# Altium footprint library DrPCB.PcbLib: 910 footprints (part 31 of 57)
Each footprint in its own frame and in the unit in brackets; x right, y up, seen from the top. Pads: shape width x height; smd on the part's side, far side on the other; paste and mask are expansions set on the pad; w line width, h text height; cw(c..) or ccw(c..) is an arc to the next point about the centre after c.
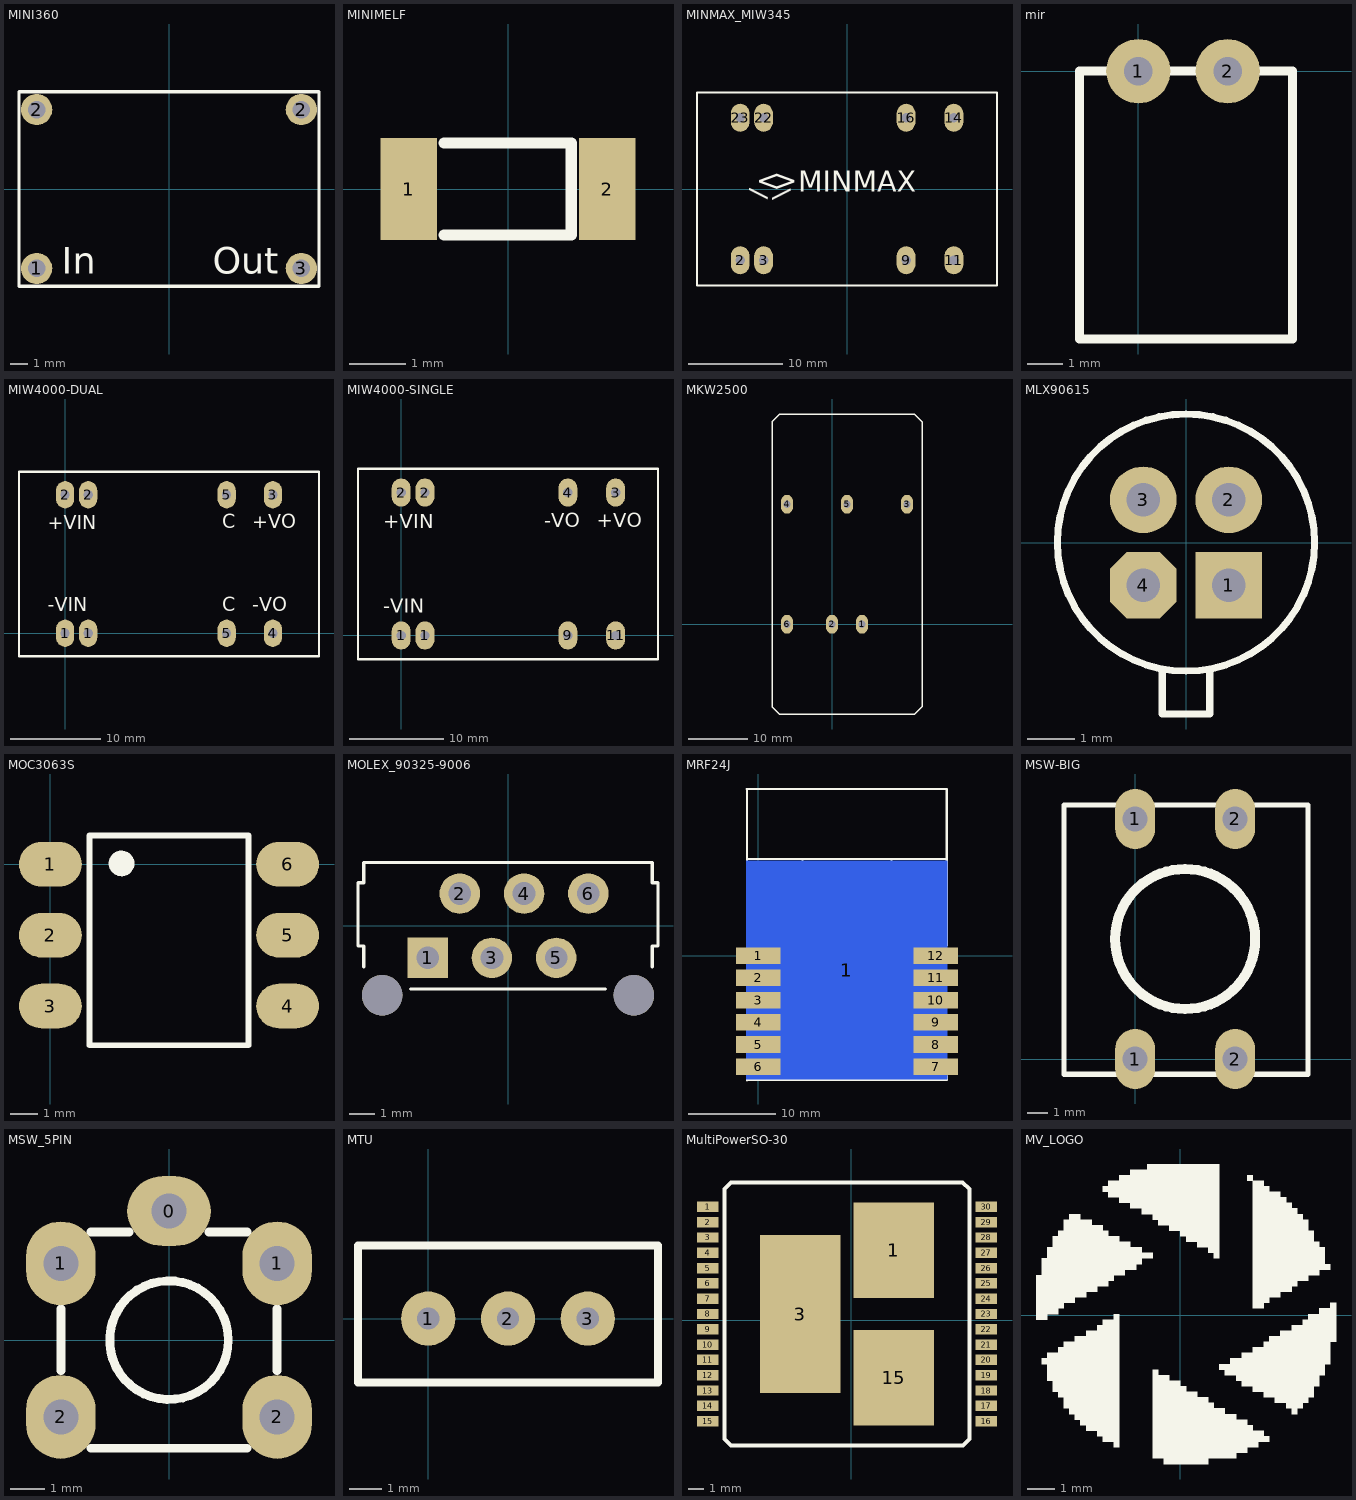
[diagram p30: the footprints below, top view; thin cyan lines are the x and y axes]

## MINI360 [mm]
pads (4):
  round 1.8 hole 1: 1(-7.62,-4.572) 2(-7.62,4.572) 2(7.62,4.572) 3(7.62,-4.572)
Top Overlay:
  lines w0.2: -8.636,-5.588 8.636,-5.588 8.636,5.588 -8.636,5.588 -8.636,-5.588
  text "Out" at 2.515,-4.889 h1.52
  text "In" at -6.172,-4.889 h1.52

## MINIMELF [mm]
pads (2):
  rect 1x1.8 smd: 1(-1.75,0) 2(1.75,0)
Top Overlay:
  lines w0.2: -1.13,-0.813 1.118,-0.813 1.118,0.813 -1.13,0.813
3D body "MiniMelfDiode.stp": height 1.63, standoff 0.04, extent -1.85,-0.797 1.85,0.797

## MINMAX_MIW345 [mm] "MINMAX_MIW3000 MIW4000 MIW5000"
pads (8):
  oval 2x3 hole 1: 2(-11.4,-7.6) 3(-8.9,-7.6) 9(6.3,-7.6) 11(11.4,-7.6) 14(11.4,7.6) 16(6.3,7.6) 22(-8.9,7.6) 23(-11.4,7.6)
Top Overlay:
  lines w0.2: -16,-10.3 16,-10.3 16,10.3 -16,10.3 -16,-10.3
  text "\" at -5.45,-0.827 h3.56
  text ">" at -7.8,-0.902 h3.81
  text "<" at -9.7,-0.902 h3.81
  text "MINMAX" at -5.18,-1.052 h3.81
  text "/" at -8.1,-1.202 h3.56
3D body "User Library-MIW4036.step": height 10.25, standoff -4, extent -15.9,-10.15 15.9,10.15

## mir [mm]
pads (2):
  round 1.8 hole 0.8: 1(0,0) 2(2.5,0)
Top Overlay:
  lines w0.254: -1.651,-7.493 -1.651,0 4.318,0 4.318,-7.493 -1.651,-7.493

## MIW4000-DUAL [mm]
pads (8):
  oval 2x3 hole 1: 1(0,0) 1(2.54,0) 2(0,15.24) 2(2.54,15.24) 3(22.86,15.24) 4(22.86,0) 5(17.78,0) 5(17.78,15.24)
Top Overlay:
  lines w0.254: -5.08,-2.54 -5.08,17.78 27.94,17.78 27.94,-2.54 -5.08,-2.54
  text "+VIN" at -1.905,11.43 h1.52
  text "-VIN" at -1.905,2.413 h1.52
  text "+VO" at 20.574,11.557 h1.52
  text "-VO" at 20.574,2.413 h1.52
  text "C" at 17.272,2.413 h1.52
  text "C" at 17.272,11.557 h1.52

## MIW4000-SINGLE [mm]
pads (8):
  oval 2x3 hole 1: 1(0,0) 1(2.54,0) 2(0,15.24) 2(2.54,15.24) 3(22.86,15.24) 4(17.78,15.24) 9(17.78,0) 11(22.86,0)
Top Overlay:
  lines w0.254: -4.597,-2.54 -4.597,17.78 27.381,17.78 27.381,-2.54 -4.597,-2.54
  text "+VIN" at -1.905,11.43 h1.52
  text "-VIN" at -1.905,2.413 h1.52
  text "+VO" at 20.828,11.557 h1.52
  text "-VO" at 15.24,11.557 h1.52
3D body "User Library-MIW5022.step": height 10.26, standoff -3.99, extent -4.47,-2.53 27.33,17.77

## MKW2500 [mm]
pads (6):
  oval 2x3.2 hole 1.2: 1(5.08,0) 2(0,0) 3(12.7,20.32) 4(-7.62,20.32) 5(2.54,20.32) 6(-7.62,0)
Top Overlay:
  lines w0.254: -10.16,-13.97 -8.93,-15.2 14.01,-15.2 15.24,-13.97 15.24,34.29 13.93,35.6 -8.85,35.6 -10.16,34.29 -10.16,-13.97

## MLX90615 [mm]
pads (4):
  rect 1.4x1.4 hole 0.7: 1(0.898,-0.898)
  round 1.4 hole 0.7: 2(0.898,0.898) 3(-0.898,0.898)
  oct 1.4x1.4 hole 0.7: 4(-0.898,-0.898)
Top Overlay:
  circle w0.15: c0,0 r2.7
  lines w0.15: -0.5,-2.654 -0.5,-3.6 0.5,-3.6 0.5,-2.672
3D body "MLX90615.STEP": height 2.7, standoff 0, extent -2.7,-3.6 2.7,2.7

## MOC3063S [mm]
pads (6):
  oval 2.25x1.6 smd: 1(0,0) 2(0,-2.54) 3(0,-5.08) 4(8.5,-5.08) 5(8.5,-2.54) 6(8.5,0)
Top Overlay:
  circle w0.2: c2.55,0.03 r0.361
  region: 2.85,-0.267 2.244,-0.267 2.244,0.33 2.85,0.33
  lines w0.2: 1.4,-6.48 7.1,-6.48 ; 1.4,-6.477 1.4,1.03 7.1,1.03 7.1,-6.477
3D body "MOC3063S-TA.STEP": height 5.09, standoff 0.01, extent -0.332,-6.795 8.833,1.715

## MOLEX_90325-9006 [mm]
pads (8):
  rect 1.6x1.6 hole 0.9: 1(-3.175,-1.27)
  round 1.6 hole 0.9: 2(-1.905,1.27) 3(-0.635,-1.27) 4(0.635,1.27) 5(1.905,-1.27) 6(3.175,1.27)
  round 1.6 hole 1.6 unplated: ""(-4.975,-2.75) ""(4.975,-2.75)
Top Overlay:
  lines w0.127: -5.7,-1.63 -5.7,-0.8 -5.93,-0.8 -5.93,1.7 -5.7,1.7 -5.7,2.5 5.7,2.5 5.7,1.7 5.93,1.7 5.93,-0.8 5.7,-0.8 5.7,-1.63 ; -3.855,-2.5 3.855,-2.5
3D body "90325-9006.stp": height 6.4, standoff -3.3, extent -5.93,-3.471 5.93,2.809

## MRF24J [mm]
pads (13):
  rect 5.08x1.905 smd: 1(-0.033,0.033) 2(-0.033,-2.507) 3(-0.033,-5.047) 4(-0.033,-7.587) 5(-0.033,-10.127) 6(-0.033,-12.667) 7(20.287,-12.667) 8(20.287,-10.127) 9(20.287,-7.587) 10(20.287,-5.047) 11(20.287,-2.507) 12(20.287,0.033)
  rect 23x25 smd far side: 1(10.109,-1.613)
Top Overlay:
  lines w0.254: -1.326,19.091 21.534,19.091 21.534,1.194 ; -1.316,1.176 -1.316,19.083 ; -1.306,-14.198 -1.306,-13.759 ; -1.303,-14.191 21.56,-14.191 21.56,-13.747 ; -1.258,11.082 21.527,11.082 ; 5.047,11.082 5.047,0.288 15.203,0.288 15.203,11.054

## MSW-BIG [mm]
pads (4):
  oval 2x3 hole 1.25: 1(0,0) 1(0,12) 2(5,0) 2(5,12)
Top Overlay:
  circle w0.5: c2.5,6 r3.5
  lines w0.254: -3.556,-0.762 8.636,-0.762 8.636,12.7 -3.556,12.7 -3.556,-0.762

## MSW_5PIN [mm]
pads (5):
  oval 2.4x2 hole 1: 0(0,3.7)
  oval 2x2.4 hole 1: 1(-3.1,2.2) 1(3.1,2.2) 2(-3.1,-2.2) 2(3.1,-2.2)
Top Overlay:
  circle w0.254: c0,0 r1.7
  lines w0.254: -3.1,-0.876 -3.1,0.889 ; -2.235,-3.1 2.235,-3.1 ; -2.235,3.1 -1.143,3.1 ; 1.143,3.099 2.235,3.099 ; 3.1,-0.876 3.1,0.889

## MTU [mm]
pads (3):
  round 1.7 hole 0.7: 1(0,0) 2(2.5,0) 3(5,0)
Top Overlay:
  lines w0.254: -2.2,-2 7.2,-2 7.2,2.286 -2.2,2.286 -2.2,-2

## MultiPowerSO-30 [mm]
pads (33):
  rect 1.4x0.68 smd: 1(-9.367,7.406) 2(-9.367,6.406) 3(-9.367,5.406) 4(-9.367,4.406) 5(-9.367,3.406) 6(-9.367,2.406) 7(-9.367,1.406) 8(-9.367,0.406) 9(-9.367,-0.594) 10(-9.367,-1.594) 11(-9.367,-2.594) 12(-9.367,-3.594) 13(-9.367,-4.594) 14(-9.367,-5.594) 15(-9.367,-6.594) 16(8.833,-6.594) 17(8.833,-5.594) 18(8.833,-4.594) 19(8.833,-3.594) 20(8.833,-2.594) 21(8.833,-1.594) 22(8.833,-0.594) 23(8.833,0.406) 24(8.833,1.406) 25(8.833,2.406) 26(8.833,3.406) 27(8.833,4.406) 28(8.833,5.406) 29(8.833,6.406) 30(8.833,7.406)
  rect 5.25x6.23 smd: 1(2.783,4.571) 15(2.783,-3.759)
  rect 5.25x10.3 smd: 3(-3.317,0.406)
Top Overlay:
  lines w0.254: -8.267,-7.761 -8.267,8.574 -7.834,9.006 7.288,9.006 7.733,8.561 7.733,-7.761 7.3,-8.194 -7.834,-8.194 -8.267,-7.761

## MV_LOGO [mm]
Top Overlay:
  drawing of 6 lines, arcs and shapes, not listed